# Altium footprint library General_Lib.PcbLib: 729 footprints (part 10 of 46)
Each footprint in its own frame and in the unit in brackets; x right, y up, seen from the top. Pads: shape width x height; smd on the part's side, far side on the other; paste and mask are expansions set on the pad; w line width, h text height; cw(c..) or ccw(c..) is an arc to the next point about the centre after c.
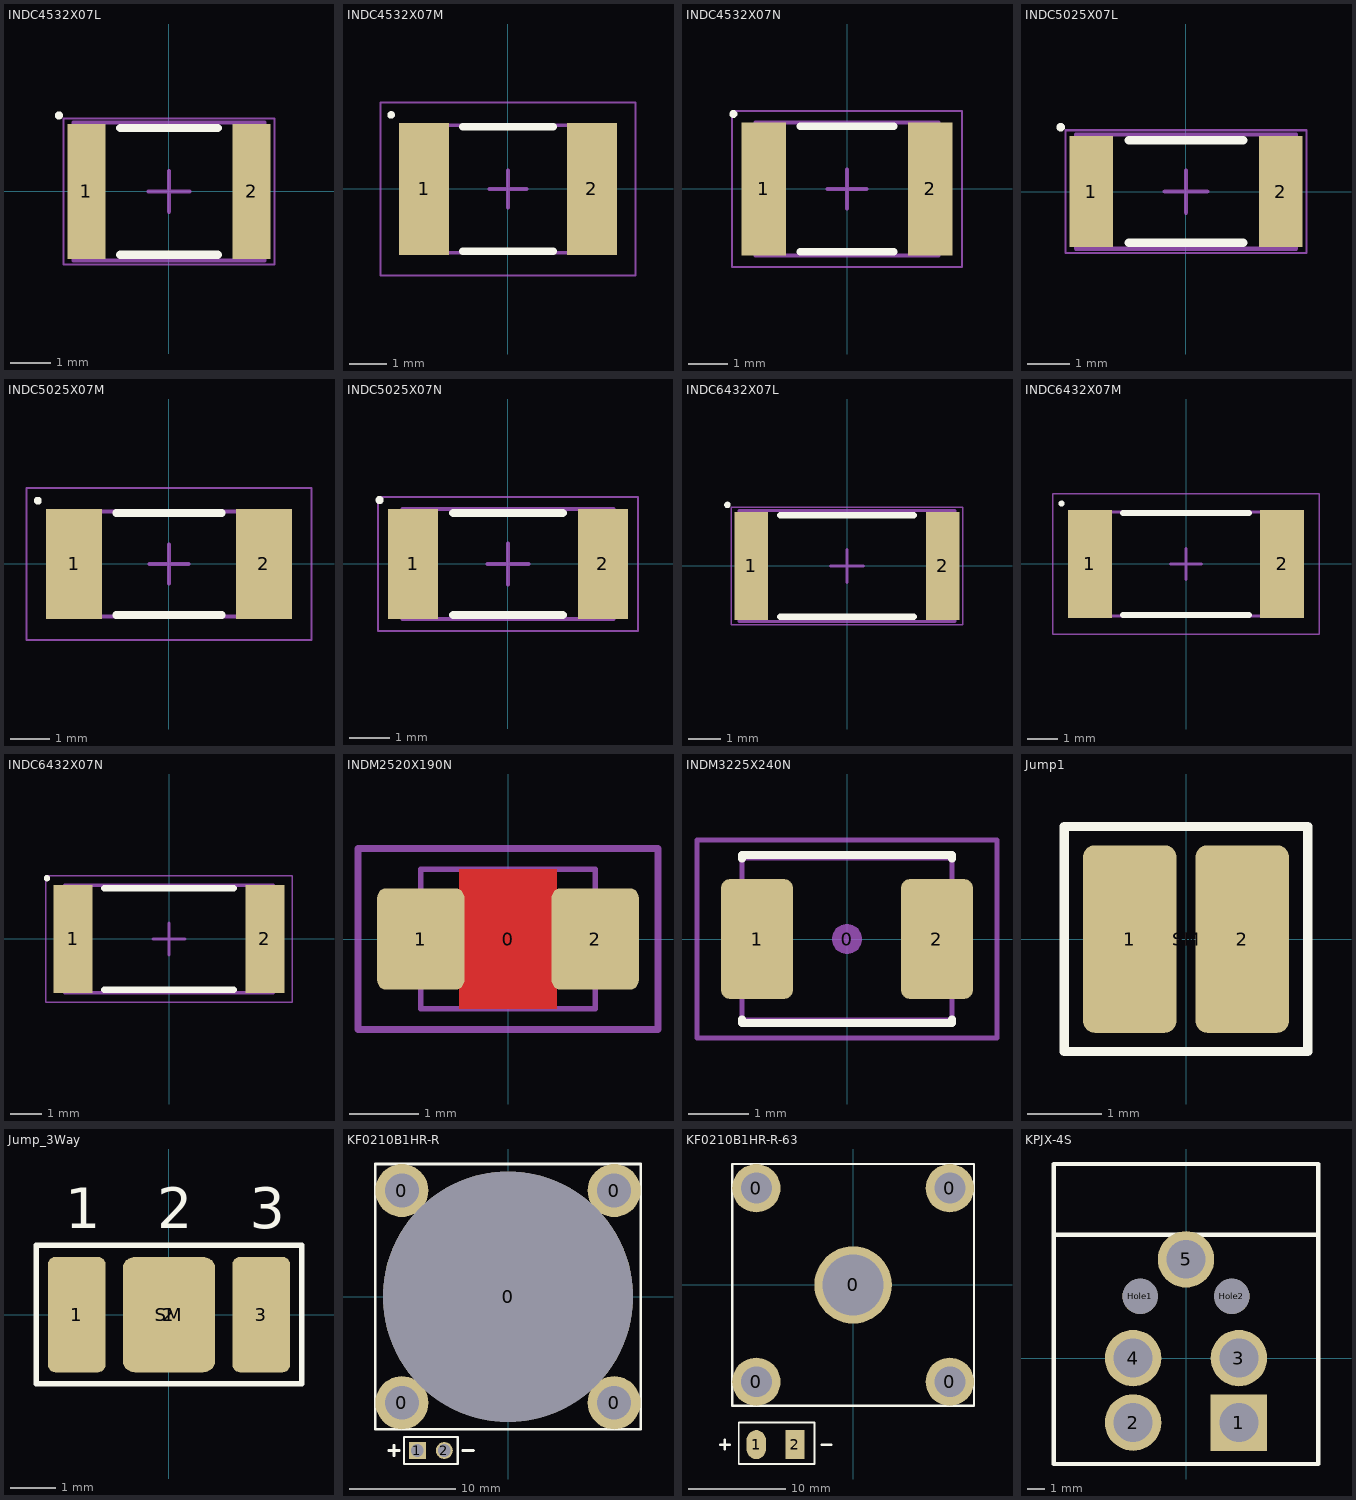
[diagram p9: the footprints below, top view; thin cyan lines are the x and y axes]

## INDC4532X07L [mm] "Chip Inductor, 2-Leads, Body 4,50x3,20mm, IPC High Density"
height 0.7
pads (2):
  rect 0.93x3.32 smd: 1(-2.035,0) 2(2.035,0)
Top Overlay:
  circle w0.1: c-2.712,1.872 r0.05
  lines w0.2: -1.2,-1.56 1.2,-1.56 ; -1.2,1.56 1.2,1.56
Mechanical 13:
  lines w0.1: -2.35,-1.7 -2.35,1.7 2.35,1.7 2.35,-1.7 -2.35,-1.7
Mechanical 15:
  lines w0.05: -2.6,-1.8 -2.6,1.8 2.6,1.8 2.6,-1.8 -2.6,-1.8
  lines w0.1: -0.5,0 0.5,0 ; 0,-0.5 0,0.5
3D body: height 0.7, standoff 0, extent -1.85,-1.7 1.85,1.7
3D body: height 0.7, standoff 0, extent -2.35,-1.7 -1.85,1.7
3D body: height 0.7, standoff 0, extent 1.85,-1.7 2.35,1.7

## INDC4532X07M [mm] "Chip Inductor, 2-Leads, Body 4,50x3,20mm, IPC Low Density"
height 0.7
pads (2):
  rect 1.33x3.52 smd: 1(-2.235,0) 2(2.235,0)
Top Overlay:
  circle w0.1: c-3.112,1.972 r0.05
  lines w0.2: -1.2,-1.66 1.2,-1.66 ; -1.2,1.66 1.2,1.66
Mechanical 13:
  lines w0.1: -2.35,-1.7 -2.35,1.7 2.35,1.7 2.35,-1.7 -2.35,-1.7
Mechanical 15:
  lines w0.05: -3.4,-2.3 -3.4,2.3 3.4,2.3 3.4,-2.3 -3.4,-2.3
  lines w0.1: -0.5,0 0.5,0 ; 0,-0.5 0,0.5
3D body: height 0.7, standoff 0, extent -1.85,-1.7 1.85,1.7
3D body: height 0.7, standoff 0, extent -2.35,-1.7 -1.85,1.7
3D body: height 0.7, standoff 0, extent 1.85,-1.7 2.35,1.7

## INDC4532X07N [mm] "Chip Inductor, 2-Leads, Body 4,50x3,20mm, IPC Medium Density"
height 0.7
pads (2):
  rect 1.13x3.42 smd: 1(-2.135,0) 2(2.135,0)
Top Overlay:
  circle w0.1: c-2.912,1.922 r0.05
  lines w0.2: -1.2,-1.61 1.2,-1.61 ; -1.2,1.61 1.2,1.61
Mechanical 13:
  lines w0.1: -2.35,-1.7 -2.35,1.7 2.35,1.7 2.35,-1.7 -2.35,-1.7
Mechanical 15:
  lines w0.05: -2.95,-2 -2.95,2 2.95,2 2.95,-2 -2.95,-2
  lines w0.1: -0.5,0 0.5,0 ; 0,-0.5 0,0.5
3D body: height 0.7, standoff 0, extent -1.85,-1.7 1.85,1.7
3D body: height 0.7, standoff 0, extent -2.35,-1.7 -1.85,1.7
3D body: height 0.7, standoff 0, extent 1.85,-1.7 2.35,1.7

## INDC5025X07L [mm] "Chip Inductor, 2-Leads, Body 5,00x2,50mm, IPC High Density"
height 0.7
pads (2):
  rect 1.03x2.62 smd: 1(-2.235,0) 2(2.235,0)
Top Overlay:
  circle w0.1: c-2.962,1.522 r0.05
  lines w0.2: -1.35,-1.21 1.35,-1.21 ; -1.35,1.21 1.35,1.21
Mechanical 13:
  lines w0.1: -2.6,-1.35 -2.6,1.35 2.6,1.35 2.6,-1.35 -2.6,-1.35
Mechanical 15:
  lines w0.05: -2.85,-1.45 -2.85,1.45 2.85,1.45 2.85,-1.45 -2.85,-1.45
  lines w0.1: -0.5,0 0.5,0 ; 0,-0.5 0,0.5
3D body: height 0.7, standoff 0, extent -2,-1.35 2,1.35
3D body: height 0.7, standoff 0, extent -2.6,-1.35 -2,1.35
3D body: height 0.7, standoff 0, extent 2,-1.35 2.6,1.35

## INDC5025X07M [mm] "Chip Inductor, 2-Leads, Body 5,00x2,50mm, IPC Low Density"
height 0.7
pads (2):
  rect 1.43x2.82 smd: 1(-2.435,0) 2(2.435,0)
Top Overlay:
  circle w0.1: c-3.362,1.622 r0.05
  lines w0.2: -1.35,-1.31 1.35,-1.31 ; -1.35,1.31 1.35,1.31
Mechanical 13:
  lines w0.1: -2.6,-1.35 -2.6,1.35 2.6,1.35 2.6,-1.35 -2.6,-1.35
Mechanical 15:
  lines w0.05: -3.65,-1.95 -3.65,1.95 3.65,1.95 3.65,-1.95 -3.65,-1.95
  lines w0.1: -0.5,0 0.5,0 ; 0,-0.5 0,0.5
3D body: height 0.7, standoff 0, extent -2,-1.35 2,1.35
3D body: height 0.7, standoff 0, extent -2.6,-1.35 -2,1.35
3D body: height 0.7, standoff 0, extent 2,-1.35 2.6,1.35

## INDC5025X07N [mm] "Chip Inductor, 2-Leads, Body 5,00x2,50mm, IPC Medium Density"
height 0.7
pads (2):
  rect 1.23x2.72 smd: 1(-2.335,0) 2(2.335,0)
Top Overlay:
  circle w0.1: c-3.162,1.572 r0.05
  lines w0.2: -1.35,-1.26 1.35,-1.26 ; -1.35,1.26 1.35,1.26
Mechanical 13:
  lines w0.1: -2.6,-1.35 -2.6,1.35 2.6,1.35 2.6,-1.35 -2.6,-1.35
Mechanical 15:
  lines w0.05: -3.2,-1.65 -3.2,1.65 3.2,1.65 3.2,-1.65 -3.2,-1.65
  lines w0.1: -0.5,0 0.5,0 ; 0,-0.5 0,0.5
3D body: height 0.7, standoff 0, extent -2,-1.35 2,1.35
3D body: height 0.7, standoff 0, extent -2.6,-1.35 -2,1.35
3D body: height 0.7, standoff 0, extent 2,-1.35 2.6,1.35

## INDC6432X07L [mm] "Chip Inductor, 2-Leads, Body 6,40x3,20mm, IPC High Density"
height 0.7
pads (2):
  rect 1.03x3.32 smd: 1(-2.935,0) 2(2.935,0)
Top Overlay:
  circle w0.1: c-3.662,1.872 r0.05
  lines w0.2: -2.05,-1.56 2.05,-1.56 ; -2.05,1.56 2.05,1.56
Mechanical 13:
  lines w0.1: -3.3,-1.7 -3.3,1.7 3.3,1.7 3.3,-1.7 -3.3,-1.7
Mechanical 15:
  lines w0.05: -3.55,-1.8 -3.55,1.8 3.55,1.8 3.55,-1.8 -3.55,-1.8
  lines w0.1: -0.5,0 0.5,0 ; 0,-0.5 0,0.5
3D body: height 0.7, standoff 0, extent -2.7,-1.7 2.7,1.7
3D body: height 0.7, standoff 0, extent -3.3,-1.7 -2.7,1.7
3D body: height 0.7, standoff 0, extent 2.7,-1.7 3.3,1.7

## INDC6432X07M [mm] "Chip Inductor, 2-Leads, Body 6,40x3,20mm, IPC Low Density"
height 0.7
pads (2):
  rect 1.43x3.52 smd: 1(-3.135,0) 2(3.135,0)
Top Overlay:
  circle w0.1: c-4.062,1.972 r0.05
  lines w0.2: -2.05,-1.66 2.05,-1.66 ; -2.05,1.66 2.05,1.66
Mechanical 13:
  lines w0.1: -3.3,-1.7 -3.3,1.7 3.3,1.7 3.3,-1.7 -3.3,-1.7
Mechanical 15:
  lines w0.05: -4.35,-2.3 -4.35,2.3 4.35,2.3 4.35,-2.3 -4.35,-2.3
  lines w0.1: -0.5,0 0.5,0 ; 0,-0.5 0,0.5
3D body: height 0.7, standoff 0, extent -2.7,-1.7 2.7,1.7
3D body: height 0.7, standoff 0, extent -3.3,-1.7 -2.7,1.7
3D body: height 0.7, standoff 0, extent 2.7,-1.7 3.3,1.7

## INDC6432X07N [mm] "Chip Inductor, 2-Leads, Body 6,40x3,20mm, IPC Medium Density"
height 0.7
pads (2):
  rect 1.23x3.42 smd: 1(-3.035,0) 2(3.035,0)
Top Overlay:
  circle w0.1: c-3.862,1.922 r0.05
  lines w0.2: -2.05,-1.61 2.05,-1.61 ; -2.05,1.61 2.05,1.61
Mechanical 13:
  lines w0.1: -3.3,-1.7 -3.3,1.7 3.3,1.7 3.3,-1.7 -3.3,-1.7
Mechanical 15:
  lines w0.05: -3.9,-2 -3.9,2 3.9,2 3.9,-2 -3.9,-2
  lines w0.1: -0.5,0 0.5,0 ; 0,-0.5 0,0.5
3D body: height 0.7, standoff 0, extent -2.7,-1.7 2.7,1.7
3D body: height 0.7, standoff 0, extent -3.3,-1.7 -2.7,1.7
3D body: height 0.7, standoff 0, extent 2.7,-1.7 3.3,1.7

## INDM2520X190N [mm] "Inductor, molded body 2.5x2.0mm"
height 1.9
pads (3):
  round 0.508 on Mech15: 0(0,0)
  rrect20% 1.25x1.45 smd: 1(-1.25,0) 2(1.25,0)
Top Layer:
  pour cut-out: -0.7,1 0.7,1 0.7,-1 -0.7,-1
Mechanical 13:
  lines w0.076: -1.25,-1 1.25,-1 1.25,1 -1.25,1 -1.25,-1
Mechanical 15:
  lines w0.1: -2.15,-1.3 2.15,-1.3 2.15,1.3 -2.15,1.3 -2.15,-1.3
3D body "INDM2520X190N.STEP": height 1.79, standoff -0.01, extent -1.25,-1 1.25,1

## INDM3225X240N [mm] "Molded Inductor, 2-Leads, Body 3.2x2.5mm, IPC Medium Density"
height 2.4
pads (3):
  round 0.508 on Mech15: 0(0,0)
  rrect25% 1.2x2 smd: 1(-1.5,0) 2(1.5,0)
Top Overlay:
  lines w0.127: -1.75,-1.338 -1.75,-1.4 1.75,-1.4 1.75,-1.338 ; -1.75,1.338 -1.75,1.4 1.75,1.4 1.75,1.338
Mechanical 13:
  lines w0.076: -1.75,-1.35 1.75,-1.35 1.75,1.35 -1.75,1.35 -1.75,-1.35
Mechanical 15:
  lines w0.076: -2.5,-1.65 2.5,-1.65 2.5,1.65 -2.5,1.65 -2.5,-1.65
3D body "INDM3225X240N.STEP": height 2.4, standoff 0, extent -1.79,-1.35 1.79,1.35

## Jump1 [mil] "SMT Battery jumper pads"
pads (3):
  rrect25% 50x100 smd: 1(-30,0) 2(30,0)
  rrect25% 118x108 on Top Solder: SM(0,0)
Top Overlay:
  lines w5: -65,-60 -65,60 65,60 65,-60 -65,-60
Mechanical 13:
  lines w3: -65,-60 -65,60 65,60 65,-60 -65,-60

## Jump_3Way [mil] "SMT Battery jumper pads"
pads (4):
  rrect25% 50x100 smd: 1(-80,0) 3(80,0)
  rrect25% 80x100 smd: 2(0,0)
  rrect25% 218x108 on Top Solder: SM(0,0)
Top Overlay:
  lines w5: -115,-60 -115,60 115,60 115,-60 -115,-60
  text "1" at -90,75 h35
  text "2" at -10,75 h35
  text "3" at 70,75 h35
Mechanical 13:
  lines w3: -115,-60 -115,60 115,60 115,-60 -115,-60

## KF0210B1HR-R [mm] "Fan KF0210B1HR-R"
height 10.3
pads (7):
  round 5 hole 3.2: 0(-10,-10) 0(-10,10) 0(10,-10) 0(10,10)
  round 23.6 hole 23.6 unplated: 0(0,0)
  rect 1.6x1.6 hole 1.2: 1(-8.54,-14.5)
  round 1.6 hole 1.2: 2(-6,-14.5)
Top Overlay:
  lines w0.2: -9.81,-15.77 -4.73,-15.77 -4.73,-13.23 -9.81,-13.23 -9.81,-15.77
  lines w0.254: -10.75,-15 -10.75,-14 ; -10.75,-14.5 -11.25,-14.5 -10.5,-14.5 -10.25,-14.5 ; -4.25,-14.5 -3.25,-14.5 ; -12.5,-12.5 -12.5,12.5 12.5,12.5 12.5,-12.5 -12.5,-12.5
3D body "Fan-1.step": height 10, standoff 0, extent -12.5,-12.6 12.5,12.5

## KF0210B1HR-R-63 [mm] "Fan KF0210B1HR-R sita"
height 10.3
pads (7):
  round 5 hole 3.2: 0(-10,-10) 0(-10,10) 0(10,-10) 0(10,10)
  round 8 hole 6.3 unplated: 0(0,0)
  oval 2x3 smd: 1(-10,-16.5)
  rect 2x3 smd: 2(-6,-16.5)
Top Overlay:
  lines w0.2: -11.81,-18.5 -11.81,-14.23 -4,-14.23 -4,-18.5 -11.81,-18.5
  lines w0.254: -13.25,-17 -13.25,-16 ; -13.25,-16.5 -13.75,-16.5 -13,-16.5 -12.75,-16.5 ; -3.25,-16.5 -2.25,-16.5 ; -12.5,-12.5 12.5,-12.5 12.5,12.5 -12.5,12.5 -12.5,-12.5
3D body "Fan-1.step": height 10, standoff 0, extent -12.5,-12.6 12.5,12.5

## KPJX-4S [mm]
height 15
pads (7):
  rect 3.2x3.2 hole 2.2: 1(3,-3.65)
  round 3.2 hole 2.2: 2(-3,-3.65) 3(3,0) 4(-3,0) 5(0,5.6)
  round 2 hole 2: Hole1(-2.6,3.5) Hole2(2.6,3.5)
Top Overlay:
  lines w0.254: -7.5,7 -7.5,11 7.5,11 7.5,7 ; -7.5,7 -7.5,-6 7.5,-6 7.5,7 ; -7.5,7 7.5,7
3D body "KPJX-4S.stp": height 15, standoff 0, extent -8,-6.5 8,11